# Altium footprint library CommonFootprints_V1.PcbLib: 80 footprints (part 5 of 5)
Each footprint in its own frame and in the unit in brackets; x right, y up, seen from the top. Pads: shape width x height; smd on the part's side, far side on the other; paste and mask are expansions set on the pad; w line width, h text height; cw(c..) or ccw(c..) is an arc to the next point about the centre after c.
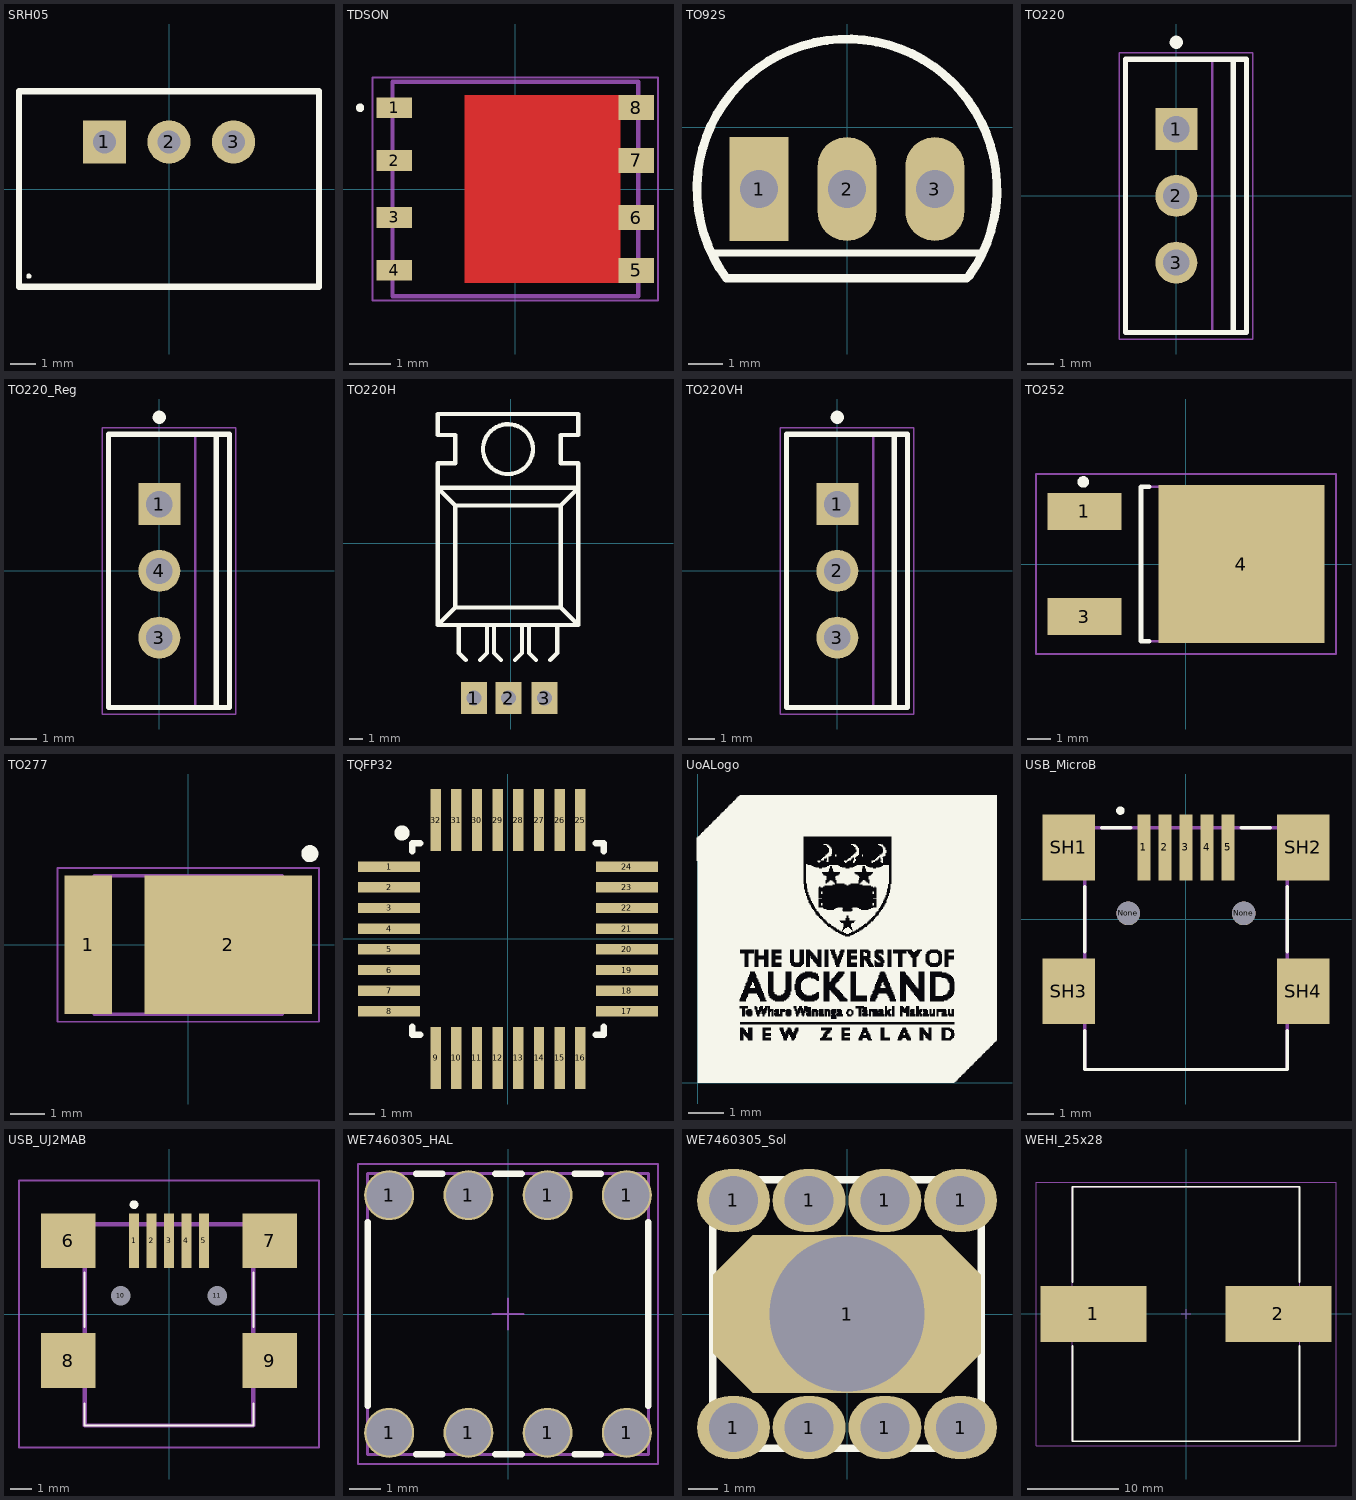
[diagram p4: the footprints below, top view; thin cyan lines are the x and y axes]

## SRH05 [mm]
pads (3):
  rect 1.7x1.7 hole 0.9: 1(-2.54,1.85)
  round 1.7 hole 0.9: 2(0,1.85) 3(2.54,1.85)
Top Overlay:
  circle w0.1: c-5.511,-3.429 r0.05
  lines w0.254: -5.9,-3.85 5.9,-3.85 5.9,3.85 -5.9,3.85 -5.9,-3.85
3D body: height 0, standoff 0, extent -2.889,1.501 -2.191,2.199
3D body: height 0, standoff 0, extent 2.191,1.501 2.889,2.199
3D body: height 0, standoff 0, extent -0.349,1.501 0.349,2.199
3D body: height 10, standoff 0, extent -5.9,-3.85 5.9,3.85

## TDSON [mm]
pads (8):
  rect 0.85x0.5 smd: 1(-2.9,1.95) 2(-2.9,0.68) 3(-2.9,-0.68) 4(-2.9,-1.95)
  rect 0.85x0.6 smd: 5(2.9,-1.955) 6(2.9,-0.685) 7(2.9,0.685) 8(2.9,1.955)
Top Layer:
  region: -1.225,2.255 -1.225,-2.255 2.525,-2.255 2.525,2.255
Top Overlay:
  circle w0.1: c-3.725,1.95 r0.05
Mechanical 13:
  lines w0.1: -2.95,-2.575 -2.95,2.575 2.95,2.575 2.95,-2.575 -2.95,-2.575
Mechanical 15:
  lines w0.05: -3.425,-2.675 -3.425,2.675 3.425,2.675 3.425,-2.675 -3.425,-2.675
  lines w0.1: -0.5,0 0.5,0 ; 0,-0.5 0,0.5
3D body: height 1.1, standoff 0, extent -2.95,-2.575 2.95,2.575

## TO92S [mm]
pads (3):
  rect 1.7x3 hole 1.1: 1(-2.54,-1.778)
  oval 1.7x3 hole 1.1: 2(0,-1.778) 3(2.54,-1.778)
Top Overlay:
  lines w0.2: -3.94,-3.628 3.86,-3.628
  lines w0.254: 3.463,-4.36 -3.484,-4.36 cw(c0,-1.778) 3.539,-4.284

## TO220 [mm] "FM, 3-Leads, Body 10.03x8.98mm, Pitch 2.54mm"
height 20.75
pads (3):
  rect 1.6x1.6 hole 1: 1(0,2.54)
  round 1.6 hole 1: 2(0,0) 3(0,-2.54)
Top Overlay:
  circle w0.25: c0,5.85 r0.125
  lines w0.2: 2.17,-5.2 2.17,5.2 ; -1.93,-5.2 -1.93,5.2 2.67,5.2 2.67,-5.2 -1.93,-5.2
Mechanical 13:
  lines w0.1: 1.37,-5.2 1.37,5.2 ; -1.93,-5.2 2.67,-5.2 2.67,5.2 -1.93,5.2 -1.93,-5.2
Mechanical 15:
  lines w0.05: -2.18,-5.45 2.92,-5.45 2.92,5.45 -2.18,5.45 -2.18,-5.45
  lines w0.1: -0.5,0 0.5,0 ; 0,-0.5 0,0.5
3D body: height 20.75, standoff 19.83, extent 1.37,-5.025 2.67,5.025
3D body: height 18.32, standoff 17.95, extent 1.37,-5.025 2.67,-1.875
3D body: height 18.32, standoff 17.95, extent 1.37,1.875 2.67,5.025
3D body: height 17.95, standoff 17.58, extent 1.37,-5.025 2.67,-1.875
3D body: height 17.95, standoff 17.58, extent 1.37,1.875 2.67,5.025
3D body: height 18.67, standoff 18.32, extent 1.37,-5.025 2.67,-1.839
3D body: height 18.67, standoff 18.32, extent 1.37,1.839 2.67,5.025
3D body: height 17.59, standoff 17.23, extent 1.37,-5.025 2.67,-1.839
3D body: height 17.59, standoff 17.23, extent 1.37,1.839 2.67,5.025
3D body: height 19, standoff 18.67, extent 1.37,-5.025 2.67,-1.732
3D body: height 19, standoff 18.67, extent 1.37,1.732 2.67,5.025
3D body: height 17.24, standoff 16.91, extent 1.37,-5.025 2.67,-1.732
3D body: height 17.24, standoff 16.91, extent 1.37,1.732 2.67,5.025
3D body: height 19.28, standoff 18.99, extent 1.37,-5.025 2.67,-1.559
3D body: height 19.28, standoff 18.99, extent 1.37,1.559 2.67,5.025
3D body: height 16.91, standoff 16.62, extent 1.37,-5.025 2.67,-1.559
3D body: height 16.91, standoff 16.62, extent 1.37,1.559 2.67,5.025
3D body: height 19.51, standoff 19.28, extent 1.37,-5.025 2.67,-1.326
3D body: height 19.51, standoff 19.28, extent 1.37,1.326 2.67,5.025
3D body: height 16.63, standoff 16.39, extent 1.37,-5.025 2.67,-1.326
3D body: height 16.63, standoff 16.39, extent 1.37,1.326 2.67,5.025
3D body: height 19.69, standoff 19.51, extent 1.37,-5.025 2.67,-1.042
3D body: height 19.69, standoff 19.51, extent 1.37,1.042 2.67,5.025
3D body: height 16.4, standoff 16.22, extent 1.37,-5.025 2.67,-1.042
3D body: height 16.4, standoff 16.22, extent 1.37,1.042 2.67,5.025
3D body: height 19.79, standoff 19.68, extent 1.37,-5.025 2.67,-0.718
3D body: height 19.79, standoff 19.68, extent 1.37,0.718 2.67,5.025
3D body: height 16.22, standoff 16.11, extent 1.37,-5.025 2.67,-0.718
3D body: height 16.22, standoff 16.11, extent 1.37,0.718 2.67,5.025
3D body: height 19.83, standoff 19.79, extent 1.37,-5.025 2.67,-0.366
3D body: height 19.83, standoff 19.79, extent 1.37,0.366 2.67,5.025
3D body: height 16.12, standoff 16.08, extent 1.37,-5.025 2.67,-0.366
3D body: height 16.12, standoff 16.08, extent 1.37,0.366 2.67,5.025
3D body: height 16.08, standoff 14.35, extent 1.37,-5.025 2.67,5.025
3D body: height 14.35, standoff 4.8, extent -1.93,-5.2 2.67,5.2
3D body: height 0, standoff -1.6, extent -0.235,-2.92 0.235,-2.16
3D body: height 4.8, standoff 0, extent -0.235,-3.13 0.235,-1.95
3D body: height 0, standoff -1.6, extent -0.235,-0.38 0.235,0.38
3D body: height 4.8, standoff 0, extent -0.235,-0.59 0.235,0.59
3D body: height 0, standoff -1.6, extent -0.235,2.16 0.235,2.92
3D body: height 4.8, standoff 0, extent -0.235,1.95 0.235,3.13

## TO220_Reg [mm] "FM, 3-Leads, Body 10.03x8.98mm, Pitch 2.54mm"
height 20.75
pads (3):
  rect 1.6x1.6 hole 1: 1(0,2.54)
  round 1.6 hole 1: 3(0,-2.54) 4(0,0)
Top Overlay:
  circle w0.25: c0,5.85 r0.125
  lines w0.2: 2.17,-5.2 2.17,5.2 ; -1.93,-5.2 2.67,-5.2 2.67,5.2 -1.93,5.2 -1.93,-5.2
Mechanical 13:
  lines w0.1: 1.37,-5.2 1.37,5.2 ; -1.93,-5.2 -1.93,5.2 2.67,5.2 2.67,-5.2 -1.93,-5.2
Mechanical 15:
  lines w0.05: -2.18,-5.45 -2.18,5.45 2.92,5.45 2.92,-5.45 -2.18,-5.45
  lines w0.1: -0.5,0 0.5,0 ; 0,-0.5 0,0.5
3D body: height 4.8, standoff 0, extent -0.235,1.95 0.235,3.13
3D body: height 0, standoff -1.6, extent -0.235,2.16 0.235,2.92
3D body: height 4.8, standoff 0, extent -0.235,-0.59 0.235,0.59
3D body: height 0, standoff -1.6, extent -0.235,-0.38 0.235,0.38
3D body: height 4.8, standoff 0, extent -0.235,-3.13 0.235,-1.95
3D body: height 0, standoff -1.6, extent -0.235,-2.92 0.235,-2.16
3D body: height 14.35, standoff 4.8, extent -1.93,-5.2 2.67,5.2
3D body: height 16.08, standoff 14.35, extent 1.37,-5.025 2.67,5.025
3D body: height 16.12, standoff 16.08, extent 1.37,0.366 2.67,5.025
3D body: height 16.12, standoff 16.08, extent 1.37,-5.025 2.67,-0.366
3D body: height 19.83, standoff 19.79, extent 1.37,0.366 2.67,5.025
3D body: height 19.83, standoff 19.79, extent 1.37,-5.025 2.67,-0.366
3D body: height 16.22, standoff 16.11, extent 1.37,0.718 2.67,5.025
3D body: height 16.22, standoff 16.11, extent 1.37,-5.025 2.67,-0.718
3D body: height 19.79, standoff 19.68, extent 1.37,0.718 2.67,5.025
3D body: height 19.79, standoff 19.68, extent 1.37,-5.025 2.67,-0.718
3D body: height 16.4, standoff 16.22, extent 1.37,1.042 2.67,5.025
3D body: height 16.4, standoff 16.22, extent 1.37,-5.025 2.67,-1.042
3D body: height 19.69, standoff 19.51, extent 1.37,1.042 2.67,5.025
3D body: height 19.69, standoff 19.51, extent 1.37,-5.025 2.67,-1.042
3D body: height 16.63, standoff 16.39, extent 1.37,1.326 2.67,5.025
3D body: height 16.63, standoff 16.39, extent 1.37,-5.025 2.67,-1.326
3D body: height 19.51, standoff 19.28, extent 1.37,1.326 2.67,5.025
3D body: height 19.51, standoff 19.28, extent 1.37,-5.025 2.67,-1.326
3D body: height 16.91, standoff 16.62, extent 1.37,1.559 2.67,5.025
3D body: height 16.91, standoff 16.62, extent 1.37,-5.025 2.67,-1.559
3D body: height 19.28, standoff 18.99, extent 1.37,1.559 2.67,5.025
3D body: height 19.28, standoff 18.99, extent 1.37,-5.025 2.67,-1.559
3D body: height 17.24, standoff 16.91, extent 1.37,1.732 2.67,5.025
3D body: height 17.24, standoff 16.91, extent 1.37,-5.025 2.67,-1.732
3D body: height 19, standoff 18.67, extent 1.37,1.732 2.67,5.025
3D body: height 19, standoff 18.67, extent 1.37,-5.025 2.67,-1.732
3D body: height 17.59, standoff 17.23, extent 1.37,1.839 2.67,5.025
3D body: height 17.59, standoff 17.23, extent 1.37,-5.025 2.67,-1.839
3D body: height 18.67, standoff 18.32, extent 1.37,1.839 2.67,5.025
3D body: height 18.67, standoff 18.32, extent 1.37,-5.025 2.67,-1.839
3D body: height 17.95, standoff 17.58, extent 1.37,1.875 2.67,5.025
3D body: height 17.95, standoff 17.58, extent 1.37,-5.025 2.67,-1.875
3D body: height 18.32, standoff 17.95, extent 1.37,1.875 2.67,5.025
3D body: height 18.32, standoff 17.95, extent 1.37,-5.025 2.67,-1.875
3D body: height 20.75, standoff 19.83, extent 1.37,-5.025 2.67,5.025

## TO220H [mm]
pads (3):
  rect 1.9x2.3 hole 1.1: 1(-2.667,-11.176) 2(-0.167,-11.176) 3(2.433,-11.176)
Top Overlay:
  circle w0.305: c-0.207,6.808 r1.803
  lines w0.305: -5.16,-5.765 -4.017,-4.622 ; -3.763,-5.892 -3.763,-7.924 -3.255,-8.432 ; -2.239,-8.432 -1.731,-7.924 -1.731,-5.892 ; -1.223,-5.892 -1.223,-7.924 -0.715,-8.432 ; 0.301,-8.432 0.809,-7.924 0.809,-5.892 ; 1.317,-5.892 1.317,-7.924 1.825,-8.432 ; 2.841,-8.432 3.349,-7.924 3.349,-5.892 ; -4.017,-4.622 3.603,-4.622 ; -4.017,-4.622 -4.017,2.744 ; -4.017,2.744 3.603,2.744 ; -4.017,2.744 -5.287,4.014 4.873,4.014 3.603,2.744 ; 3.603,-4.622 3.603,2.744 ; 3.603,-4.622 4.873,-5.892 ; 4.873,-5.892 -5.287,-5.892 -5.287,5.792 -4.017,5.792 -4.017,7.824 -5.287,7.824 -5.287,9.348 4.873,9.348 4.873,7.824 3.603,7.824 3.603,5.792 4.873,5.792 4.873,-5.892

## TO220VH [mm] "FM, 3-Leads, Body 10.03x8.98mm, Pitch 2.54mm"
height 20.75
pads (3):
  rect 1.6x1.6 hole 1: 1(0,2.54)
  round 1.6 hole 1: 2(0,0) 3(0,-2.54)
Top Overlay:
  circle w0.25: c0,5.85 r0.125
  lines w0.2: 2.17,-5.2 2.17,5.2 ; -1.93,-5.2 2.67,-5.2 2.67,5.2 -1.93,5.2 -1.93,-5.2
Mechanical 13:
  lines w0.1: 1.37,-5.2 1.37,5.2 ; -1.93,-5.2 -1.93,5.2 2.67,5.2 2.67,-5.2 -1.93,-5.2
Mechanical 15:
  lines w0.05: -2.18,-5.45 -2.18,5.45 2.92,5.45 2.92,-5.45 -2.18,-5.45
  lines w0.1: -0.5,0 0.5,0 ; 0,-0.5 0,0.5
3D body: height 4.8, standoff 0, extent -0.235,1.95 0.235,3.13
3D body: height 0, standoff -1.6, extent -0.235,2.16 0.235,2.92
3D body: height 4.8, standoff 0, extent -0.235,-0.59 0.235,0.59
3D body: height 0, standoff -1.6, extent -0.235,-0.38 0.235,0.38
3D body: height 4.8, standoff 0, extent -0.235,-3.13 0.235,-1.95
3D body: height 0, standoff -1.6, extent -0.235,-2.92 0.235,-2.16
3D body: height 14.35, standoff 4.8, extent -1.93,-5.2 2.67,5.2
3D body: height 16.08, standoff 14.35, extent 1.37,-5.025 2.67,5.025
3D body: height 16.12, standoff 16.08, extent 1.37,0.366 2.67,5.025
3D body: height 16.12, standoff 16.08, extent 1.37,-5.025 2.67,-0.366
3D body: height 19.83, standoff 19.79, extent 1.37,0.366 2.67,5.025
3D body: height 19.83, standoff 19.79, extent 1.37,-5.025 2.67,-0.366
3D body: height 16.22, standoff 16.11, extent 1.37,0.718 2.67,5.025
3D body: height 16.22, standoff 16.11, extent 1.37,-5.025 2.67,-0.718
3D body: height 19.79, standoff 19.68, extent 1.37,0.718 2.67,5.025
3D body: height 19.79, standoff 19.68, extent 1.37,-5.025 2.67,-0.718
3D body: height 16.4, standoff 16.22, extent 1.37,1.042 2.67,5.025
3D body: height 16.4, standoff 16.22, extent 1.37,-5.025 2.67,-1.042
3D body: height 19.69, standoff 19.51, extent 1.37,1.042 2.67,5.025
3D body: height 19.69, standoff 19.51, extent 1.37,-5.025 2.67,-1.042
3D body: height 16.63, standoff 16.39, extent 1.37,1.326 2.67,5.025
3D body: height 16.63, standoff 16.39, extent 1.37,-5.025 2.67,-1.326
3D body: height 19.51, standoff 19.28, extent 1.37,1.326 2.67,5.025
3D body: height 19.51, standoff 19.28, extent 1.37,-5.025 2.67,-1.326
3D body: height 16.91, standoff 16.62, extent 1.37,1.559 2.67,5.025
3D body: height 16.91, standoff 16.62, extent 1.37,-5.025 2.67,-1.559
3D body: height 19.28, standoff 18.99, extent 1.37,1.559 2.67,5.025
3D body: height 19.28, standoff 18.99, extent 1.37,-5.025 2.67,-1.559
3D body: height 17.24, standoff 16.91, extent 1.37,1.732 2.67,5.025
3D body: height 17.24, standoff 16.91, extent 1.37,-5.025 2.67,-1.732
3D body: height 19, standoff 18.67, extent 1.37,1.732 2.67,5.025
3D body: height 19, standoff 18.67, extent 1.37,-5.025 2.67,-1.732
3D body: height 17.59, standoff 17.23, extent 1.37,1.839 2.67,5.025
3D body: height 17.59, standoff 17.23, extent 1.37,-5.025 2.67,-1.839
3D body: height 18.67, standoff 18.32, extent 1.37,1.839 2.67,5.025
3D body: height 18.67, standoff 18.32, extent 1.37,-5.025 2.67,-1.839
3D body: height 17.95, standoff 17.58, extent 1.37,1.875 2.67,5.025
3D body: height 17.95, standoff 17.58, extent 1.37,-5.025 2.67,-1.875
3D body: height 18.32, standoff 17.95, extent 1.37,1.875 2.67,5.025
3D body: height 18.32, standoff 17.95, extent 1.37,-5.025 2.67,-1.875
3D body: height 20.75, standoff 19.83, extent 1.37,-5.025 2.67,5.025

## TO252 [mm] "D-PAK, 4-Leads, Body 6.1x6.5mm, Pitch 2.28mm, Lead Span 9.7mm, IPC Low Density"
height 2.38
pads (3):
  rect 3.2x1.6 smd: 1(-4.392,2.28) 3(-4.392,-2.28)
  rect 7.2x6.85 smd: 4(2.408,0)
Top Overlay:
  circle w0.25: c-4.445,3.556 r0.125
  lines w0.2: -1.592,-3.35 -1.942,-3.35 -1.942,3.35 -1.592,3.35
Mechanical 13:
  lines w0.1: -1.942,-3.35 4.258,-3.35 4.258,3.35 -1.942,3.35 -1.942,-3.35
Mechanical 15:
  lines w0.1: -0.492,0 0.508,0 ; 0.008,-0.5 0.008,0.5 ; -6.492,-3.9 6.508,-3.9 6.508,3.9 -6.492,3.9 -6.492,-3.9
3D body: height 2.38, standoff 0, extent -1.942,-3.35 4.258,3.35

## TO277 [mm] "PowerDI Package"
height 1.1
pads (2):
  rect 1.4x4.05 smd: 1(-2.925,0)
  rect 4.9x4.05 smd: 2(1.175,0)
Top Overlay:
  circle w0.25: c3.556,2.667 r0.125
Mechanical 13:
  lines w0.1: -2.75,-2.025 2.75,-2.025 2.75,2.025 -2.75,2.025 -2.75,-2.025
Mechanical 15:
  lines w0.05: -3.825,-2.25 3.825,-2.25 3.825,2.25 -3.825,2.25 -3.825,-2.25
  lines w0.1: -0.5,0 0.5,0 ; 0,-0.5 0,0.5
3D body: height 1.1, standoff 0, extent -2.75,-2.025 2.75,2.025

## TQFP32 [mm]
pads (32):
  rect 2.4x0.4 smd: 1(-4.6,2.8) 2(-4.6,2) 3(-4.6,1.2) 4(-4.6,0.4) 5(-4.6,-0.4) 6(-4.6,-1.2) 7(-4.6,-2) 8(-4.6,-2.8) 17(4.6,-2.8) 18(4.6,-2) 19(4.6,-1.2) 20(4.6,-0.4) 21(4.6,0.4) 22(4.6,1.2) 23(4.6,2) 24(4.6,2.8)
  rect 0.4x2.4 smd: 9(-2.8,-4.6) 10(-2,-4.6) 11(-1.2,-4.6) 12(-0.4,-4.6) 13(0.4,-4.6) 14(1.2,-4.6) 15(2,-4.6) 16(2.8,-4.6) 25(2.8,4.6) 26(2,4.6) 27(1.2,4.6) 28(0.4,4.6) 29(-0.4,4.6) 30(-1.2,4.6) 31(-2,4.6) 32(-2.8,4.6)
Top Overlay:
  circle w0.3: c-4.1,4.1 r0.141
  lines w0.254: -3.7,-3.4 -3.7,-3.7 -3.4,-3.7 ; -3.7,3.4 -3.7,3.7 -3.4,3.7 ; 3.4,-3.7 3.7,-3.7 3.7,-3.4 ; 3.4,3.7 3.7,3.7 3.7,3.4
3D body: height 1.3, standoff 0.1, extent -3,2 -2.004,2.998
3D body: height 1.2, standoff 0, extent -3.5,-3.5 3.5,3.5

## UoALogo [mm]
Top Overlay:
  drawing of 24 lines, arcs and shapes, not listed

## USB_MicroB [mm]
pads (11):
  rect 0.5x2.5 smd: 1(-1.6,2.74) 2(-0.8,2.74) 3(0,2.74) 4(0.8,2.74) 5(1.6,2.74)
  round 0.9 hole 0.9 unplated: None(-2.2,0.23) None(2.2,0.23)
  rect 2x2.5 smd: SH1(-4.46,2.74) SH2(4.46,2.74) SH3(-4.46,-2.74) SH4(4.46,-2.74)
Top Overlay:
  circle w0.16: c-2.5,4.14 r0.08
  lines w0.127: -3.86,-4.24 -3.86,-5.71 3.86,-5.71 3.86,-4.24 ; -3.86,-1.24 -3.86,1.24 ; -3.21,3.49 -2.1,3.49 ; 2.1,3.49 3.21,3.49 ; 3.86,-1.24 3.86,1.24
Mechanical 4:
  circle w0.16: c-1.6,2.89 r0.08
  circle w0.16: c-1.6,2.89 r0.08
  lines w0.127: -3.86,-5.71 3.86,-5.71 ; -3.86,-5.71 -3.86,3.49 ; -3.86,-5.71 3.86,-5.71 ; -3.86,-5.71 -3.86,3.49 ; -3.86,3.49 3.86,3.49 ; -3.86,3.49 3.86,3.49 ; 3.86,-5.71 3.86,-5.11 ; 3.86,-5.71 3.86,-5.11 ; 3.86,-5.11 3.86,3.49 ; 3.86,-5.11 3.86,3.49
3D body "CUI_DEVICES_UJ2-MBH-4-SMT.step": height 3.9, standoff -1, extent -4.83,-5.56 4.83,3.84

## USB_UJ2MAB [mm]
pads (11):
  rect 0.45x2.5 smd: 1(-1.6,3.35) 2(-0.8,3.35) 3(0,3.35) 4(0.8,3.35) 5(1.6,3.35)
  rect 2.5x2.5 smd: 6(-4.61,3.35) 7(4.61,3.35) 8(-4.61,-2.13) 9(4.61,-2.13)
  round 0.45 hole 0.9 unplated: 10(-2.2,0.84) 11(2.2,0.84)
Top Overlay:
  lines w0.1: -3.86,-4.1 -3.86,-5.1 3.86,-5.1 3.86,-4.1 ; -3.86,-0.6 -3.86,1.9 ; 3.86,-0.6 3.86,1.9
  lines w0.2: -1.7,5 ccw(c-1.6,5) -1.5,5 ccw(c-1.6,5) -1.7,5
Mechanical 13:
  lines w0.2: -3.86,-5.1 -3.86,4.1 3.86,4.1 3.86,-5.1 -3.86,-5.1
Mechanical 15:
  lines w0.1: -6.86,-6.1 -6.86,6.1 6.86,6.1 6.86,-6.1 -6.86,-6.1
3D body "CUI_UJ2-MABH-1-SMT.step": height 4.13, standoff -0.75, extent -4.83,-5.18 4.83,4.2

## WE7460305_HAL [mm] "WP-BUTR Bushes with two Rows Pin-Plate, M5, blind thr 6mm"
height 7
pads (8):
  round 1.6 hole 1.45: 1(-3.81,-3.81) 1(-3.81,3.81) 1(-1.27,-3.81) 1(-1.27,3.81) 1(1.27,-3.81) 1(1.27,3.81) 1(3.81,-3.81) 1(3.81,3.81)
Top Overlay:
  lines w0.2: -4.5,-2.95 -4.5,2.95 ; -2.95,-4.5 -2.1,-4.5 ; -2.95,4.5 -2.1,4.5 ; -0.41,-4.5 0.44,-4.5 ; -0.41,4.5 0.44,4.5 ; 2.13,-4.5 2.98,-4.5 ; 2.13,4.5 2.98,4.5 ; 4.5,-2.95 4.5,2.95
Mechanical 13:
  lines w0.1: -4.5,-4.5 4.5,-4.5 4.5,4.5 -4.5,4.5 -4.5,-4.5
Mechanical 15:
  lines w0.05: -0.5,0 0.5,0 ; 0,-0.5 0,0.5 ; -4.81,-4.81 4.81,-4.81 4.81,4.81 -4.81,4.81 -4.81,-4.81
3D body "7460305.stp": height 7, standoff -3.5, extent -4.5,-4.5 4.5,4.5

## WE7460305_Sol [mm] "WP-BUTR Bushes with two Rows Pin-Plate, M5, blind thr 6mm"
height 10.5
pads (9):
  oval 2.45x2.1 hole 1.65: 1(-3.81,-3.81) 1(-3.81,3.81) 1(-1.27,-3.81) 1(-1.27,3.81) 1(1.27,-3.81) 1(1.27,3.81) 1(3.81,-3.81) 1(3.81,3.81)
  oct 9x5.3 hole 5.2: 1(0,0)
Top Overlay:
  lines w0.254: -4.5,-4.5 4.5,-4.5 4.5,4.5 -4.5,4.5 -4.5,-4.5
3D body "7460305.stp": height 7.05, standoff -3.45, extent -4.5,-4.5 4.5,4.5

## WEHI_25x28 [mm] "Wire Wound Inductor, 2-Leads, Body 25.50x28.50mm, IPC Low Density"
height 21
pads (2):
  rect 11.65x6.2 smd: 1(-10.175,0) 2(10.175,0)
Top Overlay:
  lines w0.2: -12.5,-3.5 -12.5,-14 12.5,-14 12.5,-3.5 ; -12.5,3.5 -12.5,14 12.5,14 12.5,3.5
Mechanical 13:
  lines w0.1: -12.5,-14 12.5,-14 12.5,14 -12.5,14 -12.5,-14
Mechanical 15:
  lines w0.05: -16.5,-14.5 16.5,-14.5 16.5,14.5 -16.5,14.5 -16.5,-14.5
  lines w0.1: -0.5,0 0.5,0 ; 0,-0.5 0,0.5
3D body: height 21, standoff 0, extent -12.5,-14 12.5,14